# Altium footprint library heromap.PcbLib: 593 footprints (part 5 of 38)
Each footprint in its own frame and in the unit in brackets; x right, y up, seen from the top. Pads: shape width x height; smd on the part's side, far side on the other; paste and mask are expansions set on the pad; w line width, h text height; cw(c..) or ccw(c..) is an arc to the next point about the centre after c.
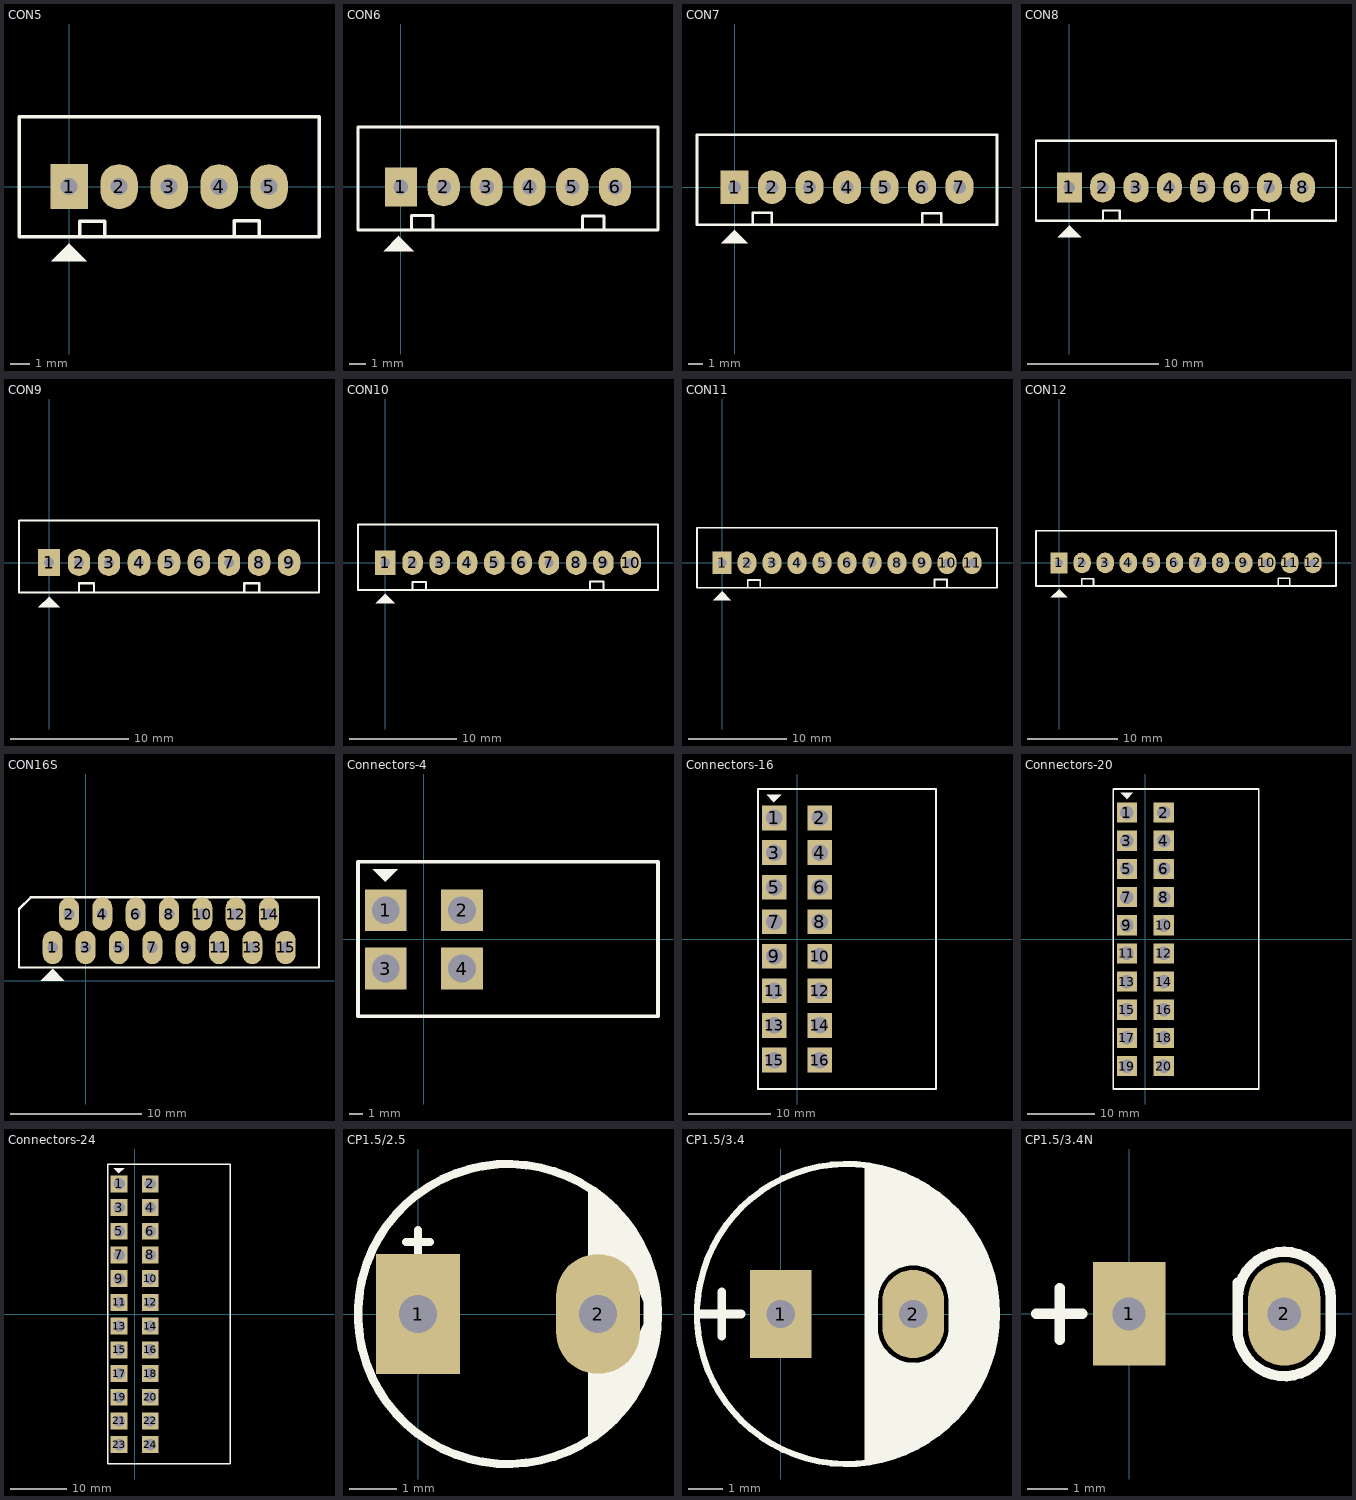
[diagram p4: the footprints below, top view; thin cyan lines are the x and y axes]

## CON5 [mil] "CON5"
height 200
pads (5):
  rect 75x90 hole 34: 1(0,0)
  oval 75x90 hole 34: 2(100,0) 3(200,0) 4(300,0) 5(400,0)
Top Overlay:
  region: -35.5,-149.5 35.5,-149.5 0.5,-114.5 0.5,-113.5
  lines w7: 21,-99 21,-69 71,-69 71,-99 ; 330,-98 330,-68 380,-68 380,-98 ; -100,-100 500,-100 500,0 500,140 -100,140 -100,-100

## CON6 [mil] "CON6"
height 200
pads (6):
  rect 75x90 hole 34: 1(0,0)
  oval 75x90 hole 34: 2(100,0) 3(200,0) 4(300,0) 5(400,0) 6(500,0)
Top Overlay:
  region: -40.5,-149.5 30.5,-149.5 -4.5,-114.5 -4.5,-113.5
  lines w7: 25,-97 25,-67 75,-67 75,-97 ; 424,-98 424,-68 474,-68 474,-98 ; -100,-100 600,-100 600,0 600,140 -100,140 -100,-100

## CON7 [mil] "CON7"
height 200
pads (7):
  rect 75x90 hole 34: 1(0,0)
  oval 75x90 hole 34: 2(100,0) 3(200,0) 4(300,0) 5(400,0) 6(500,0) 7(600,0)
Top Overlay:
  region: -35.5,-149.5 35.5,-149.5 0.5,-114.5 0.5,-113.5
  lines w7: 49,-98 49,-68 99,-68 99,-98 ; 501,-99 501,-69 551,-69 551,-99 ; -100,-100 -100,140 700,140 700,0 700,-100 -100,-100

## CON8 [mil] "CON8"
height 200
pads (8):
  rect 75x90 hole 34: 1(0,0)
  oval 75x90 hole 34: 2(100,0) 3(200,0) 4(300,0) 5(400,0) 6(500,0) 7(600,0) 8(700,0)
Top Overlay:
  region: -35.5,-149.5 35.5,-149.5 0.5,-114.5 0.5,-113.5
  lines w7: 101,-99 101,-69 151,-69 151,-99 ; 549,-98 549,-68 599,-68 599,-98 ; -100,-100 -100,140 800,140 800,0 800,-100 -100,-100

## CON9 [mil] "CON9"
height 200
pads (9):
  rect 75x90 hole 34: 1(0,0)
  oval 75x90 hole 34: 2(100,0) 3(200,0) 4(300,0) 5(400,0) 6(500,0) 7(600,0) 8(700,0) 9(800,0)
Top Overlay:
  region: -35.5,-149.5 35.5,-149.5 0.5,-114.5 0.5,-113.5
  lines w7: 100,-99 100,-69 150,-69 150,-99 ; 651,-99 651,-69 701,-69 701,-99 ; -100,-100 -100,140 900,140 900,0 900,-100 -100,-100

## CON10 [mil] "CON10"
height 200
pads (10):
  rect 75x90 hole 34: 1(0,0)
  oval 75x90 hole 34: 2(100,0) 3(200,0) 4(300,0) 5(400,0) 6(500,0) 7(600,0) 8(700,0) 9(800,0) 10(900,0)
Top Overlay:
  region: -35.5,-149.5 35.5,-149.5 0.5,-114.5 0.5,-113.5
  lines w7: 100,-100 100,-70 150,-70 150,-100 ; 750,-99 750,-69 800,-69 800,-99 ; -100,-100 -100,140 1000,140 1000,0 1000,-100 -100,-100

## CON11 [mil] "CON11"
height 200
pads (11):
  rect 75x90 hole 34: 1(0,0)
  oval 75x90 hole 34: 2(100,0) 3(200,0) 4(300,0) 5(400,0) 6(500,0) 7(600,0) 8(700,0) 9(800,0) 10(900,0) 11(1000,0)
Top Overlay:
  region: -35.5,-149.5 35.5,-149.5 0.5,-114.5 0.5,-113.5
  lines w7: 103,-99 103,-69 153,-69 153,-99 ; 850,-97 850,-67 900,-67 900,-97 ; -100,-100 -100,140 1100,140 1100,0 1100,-100 -100,-100

## CON12 [mil] "CON12"
height 200
pads (12):
  rect 75x90 hole 34: 1(0,0)
  oval 75x90 hole 34: 2(100,0) 3(200,0) 4(300,0) 5(400,0) 6(500,0) 7(600,0) 8(700,0) 9(800,0) 10(900,0) 11(1000,0) 12(1100,0)
Top Overlay:
  region: -35.5,-149.5 35.5,-149.5 0.5,-114.5 0.5,-113.5
  lines w7: 99,-99 99,-69 149,-69 149,-99 ; 950,-97 950,-67 1000,-67 1000,-97 ; -100,-100 -100,140 1200,140 1200,0 1200,-100 -100,-100

## CON16S [mil] "Jam 16S"
pads (15):
  oval 60x100 hole 32: 1(-99,100) 2(-50,200) 3(0,100) 4(50,200) 5(100,100) 6(150,200) 7(200,100) 8(250,200) 9(300,100) 10(350,200) 11(400,100) 12(450,200) 13(500,100) 14(550,200) 15(600,100)
Top Overlay:
  region: -135.5,0.5 -64.5,0.5 -99.5,35.5 -99.5,36.5
  lines w7: -200,40 700,40 700,250 -165,250 -200,215 -200,40

## Connectors-4 [mm]
pads (4):
  rect 3x3 hole 2: 1(-2.75,2.1) 2(2.75,2.1) 3(-2.75,-2.1) 4(2.75,-2.1)
Top Overlay:
  region: -1.892,5.067 -3.696,5.067 -2.807,4.178 -2.807,4.153
  lines w0.254: -4.759,-5.557 -4.759,5.617 16.9,5.617 16.9,-5.557 -4.759,-5.557
3D body: height 3.5, standoff 2.5, extent 2.032,1.294 4.75,2.818
3D body: height 7.7, standoff 6.7, extent -3.454,1.294 5.817,2.818
3D body: height 7.7, standoff -1, extent -3.454,1.294 -2.083,2.818
3D body: height 3.5, standoff 0, extent 2.057,1.294 3.454,2.818
3D body: height 3.5, standoff 0, extent 2.057,-2.906 3.454,-1.382
3D body: height 7.7, standoff -1, extent -3.454,-2.906 -2.083,-1.382
3D body: height 7.7, standoff 6.7, extent -3.454,-2.906 5.817,-1.382
3D body: height 3.5, standoff 2.5, extent 2.032,-2.906 4.75,-1.382
3D body: height 11.2, standoff 10.2, extent 13.818,-1.543 16.917,1.656
3D body: height 10.2, standoff 0, extent 3.873,-5.277 17.027,5.227

## Connectors-16 [mm]
pads (16):
  rect 3x3 hole 2: 1(-2.75,14.7) 2(2.75,14.7) 3(-2.75,10.5) 4(2.75,10.5) 5(-2.75,6.3) 6(2.75,6.3) 7(-2.75,2.1) 8(2.75,2.1) 9(-2.75,-2.1) 10(2.75,-2.1) 11(-2.75,-6.3) 12(2.75,-6.3) 13(-2.75,-10.5) 14(2.75,-10.5) 15(-2.75,-14.7) 16(2.75,-14.7)
Top Overlay:
  region: -1.892,17.513 -3.696,17.513 -2.807,16.624 -2.807,16.599
  lines w0.254: -4.759,-18.217 16.9,-18.217 16.9,18.217 -4.759,18.217 -4.759,-18.217
3D body: height 11.2, standoff 10.2, extent 13.801,-1.599 16.899,1.599
3D body: height 3.5, standoff 2.5, extent 2.032,-15.506 4.75,-13.982
3D body: height 7.7, standoff 6.7, extent -3.454,-15.506 5.817,-13.982
3D body: height 7.7, standoff -1, extent -3.454,-15.506 -2.083,-13.982
3D body: height 3.5, standoff 0, extent 2.057,-15.506 3.454,-13.982
3D body: height 3.5, standoff 2.5, extent 2.032,-11.306 4.75,-9.782
3D body: height 7.7, standoff 6.7, extent -3.454,-11.306 5.817,-9.782
3D body: height 7.7, standoff -1, extent -3.454,-11.306 -2.083,-9.782
3D body: height 3.5, standoff 0, extent 2.057,-11.306 3.454,-9.782
3D body: height 3.5, standoff 2.5, extent 2.032,-7.106 4.75,-5.582
3D body: height 7.7, standoff 6.7, extent -3.454,-7.106 5.817,-5.582
3D body: height 7.7, standoff -1, extent -3.454,-7.106 -2.083,-5.582
3D body: height 3.5, standoff 0, extent 2.057,-7.106 3.454,-5.582
3D body: height 3.5, standoff 2.5, extent 2.032,-2.906 4.75,-1.382
3D body: height 7.7, standoff 6.7, extent -3.454,-2.906 5.817,-1.382
3D body: height 7.7, standoff -1, extent -3.454,-2.906 -2.083,-1.382
3D body: height 3.5, standoff 0, extent 2.057,-2.906 3.454,-1.382
3D body: height 3.5, standoff 2.5, extent 2.032,1.294 4.75,2.818
3D body: height 7.7, standoff 6.7, extent -3.454,1.294 5.817,2.818
3D body: height 7.7, standoff -1, extent -3.454,1.294 -2.083,2.818
3D body: height 3.5, standoff 0, extent 2.057,1.294 3.454,2.818
3D body: height 3.5, standoff 2.5, extent 2.032,5.494 4.75,7.018
3D body: height 7.7, standoff 6.7, extent -3.454,5.494 5.817,7.018
3D body: height 7.7, standoff -1, extent -3.454,5.494 -2.083,7.018
3D body: height 3.5, standoff 0, extent 2.057,5.494 3.454,7.018
3D body: height 3.5, standoff 2.5, extent 2.032,9.694 4.75,11.218
3D body: height 7.7, standoff 6.7, extent -3.454,9.694 5.817,11.218
3D body: height 7.7, standoff -1, extent -3.454,9.694 -2.083,11.218
3D body: height 3.5, standoff 0, extent 2.057,9.694 3.454,11.218
3D body: height 3.5, standoff 0, extent 2.057,13.894 3.454,15.418
3D body: height 7.7, standoff -1, extent -3.454,13.894 -2.083,15.418
3D body: height 7.7, standoff 6.7, extent -3.454,13.894 5.817,15.418
3D body: height 10.2, standoff 0, extent 3.873,-17.827 17.027,17.827
3D body: height 3.5, standoff 2.5, extent 2.032,13.894 4.75,15.418

## Connectors-20 [mm]
pads (20):
  rect 3x3 hole 2: 1(-2.75,18.9) 2(2.75,18.9) 3(-2.75,14.7) 4(2.75,14.7) 5(-2.75,10.5) 6(2.75,10.5) 7(-2.75,6.3) 8(2.75,6.3) 9(-2.75,2.1) 10(2.75,2.1) 11(-2.75,-2.1) 12(2.75,-2.1) 13(-2.75,-6.3) 14(2.75,-6.3) 15(-2.75,-10.5) 16(2.75,-10.5) 17(-2.75,-14.7) 18(2.75,-14.7) 19(-2.75,-18.9) 20(2.75,-18.9)
Top Overlay:
  region: -1.848,21.831 -3.652,21.831 -2.763,20.942 -2.763,20.917
  lines w0.254: -4.759,-22.31 16.9,-22.31 16.9,22.417 -4.759,22.417 -4.759,-22.31
3D body: height 10.2, standoff 0, extent 3.81,-21.98 17.027,22.027
3D body: height 3.5, standoff 0, extent 2.057,-11.306 3.454,-9.782
3D body: height 7.7, standoff -1, extent -3.454,-11.306 -2.083,-9.782
3D body: height 7.7, standoff 6.7, extent -3.454,-11.306 5.817,-9.782
3D body: height 3.5, standoff 2.5, extent 2.032,-11.306 4.75,-9.782
3D body: height 3.5, standoff 2.5, extent 2.032,-11.306 4.75,-9.782
3D body: height 7.7, standoff -1, extent -3.454,-11.306 -2.083,-9.782
3D body: height 3.5, standoff 0, extent 2.057,-11.306 3.454,-9.782
3D body: height 3.5, standoff 0, extent 2.057,-15.506 3.454,-13.982
3D body: height 7.7, standoff -1, extent -3.454,-15.506 -2.083,-13.982
3D body: height 7.7, standoff 6.7, extent -3.454,-15.506 5.817,-13.982
3D body: height 3.5, standoff 2.5, extent 2.032,-15.506 4.75,-13.982
3D body: height 3.5, standoff 0, extent 2.057,-19.706 3.454,-18.182
3D body: height 7.7, standoff -1, extent -3.454,-19.706 -2.083,-18.182
3D body: height 7.7, standoff 6.7, extent -3.454,-19.706 5.817,-18.182
3D body: height 3.5, standoff 2.5, extent 2.032,-19.706 4.75,-18.182
3D body: height 11.2, standoff 10.2, extent 13.691,-1.481 16.79,1.718
3D body: height 3.5, standoff 2.5, extent 2.032,-7.106 4.75,-5.582
3D body: height 7.7, standoff 6.7, extent -3.454,-7.106 5.817,-5.582
3D body: height 7.7, standoff -1, extent -3.454,-7.106 -2.083,-5.582
3D body: height 3.5, standoff 0, extent 2.057,-7.106 3.454,-5.582
3D body: height 3.5, standoff 2.5, extent 2.032,-2.906 4.75,-1.382
3D body: height 7.7, standoff 6.7, extent -3.454,-2.906 5.817,-1.382
3D body: height 7.7, standoff -1, extent -3.454,-2.906 -2.083,-1.382
3D body: height 3.5, standoff 0, extent 2.057,-2.906 3.454,-1.382
3D body: height 3.5, standoff 2.5, extent 2.032,1.294 4.75,2.818
3D body: height 7.7, standoff 6.7, extent -3.454,1.294 5.817,2.818
3D body: height 7.7, standoff -1, extent -3.454,1.294 -2.083,2.818
3D body: height 3.5, standoff 0, extent 2.057,1.294 3.454,2.818
3D body: height 3.5, standoff 2.5, extent 2.032,5.494 4.75,7.018
3D body: height 7.7, standoff 6.7, extent -3.454,5.494 5.817,7.018
3D body: height 7.7, standoff -1, extent -3.454,5.494 -2.083,7.018
3D body: height 3.5, standoff 0, extent 2.057,5.494 3.454,7.018
3D body: height 3.5, standoff 2.5, extent 2.032,9.694 4.75,11.218
3D body: height 7.7, standoff 6.7, extent -3.454,9.694 5.817,11.218
3D body: height 7.7, standoff -1, extent -3.454,9.694 -2.083,11.218
3D body: height 3.5, standoff 0, extent 2.057,9.694 3.454,11.218
3D body: height 3.5, standoff 2.5, extent 2.032,13.894 4.75,15.418
3D body: height 7.7, standoff 6.7, extent -3.454,13.894 5.817,15.418
3D body: height 7.7, standoff -1, extent -3.454,13.894 -2.083,15.418
3D body: height 3.5, standoff 0, extent 2.057,13.894 3.454,15.418
3D body: height 3.5, standoff 0, extent 2.057,18.094 3.454,19.618
3D body: height 7.7, standoff -1, extent -3.454,18.094 -2.083,19.618
3D body: height 7.7, standoff 6.7, extent -3.454,18.094 5.817,19.618
3D body: height 3.5, standoff 2.5, extent 2.032,18.094 4.75,19.618

## Connectors-24 [mm]
pads (24):
  rect 3x3 hole 2: 1(-2.75,23.1) 2(2.75,23.1) 3(-2.75,18.9) 4(2.75,18.9) 5(-2.75,14.7) 6(2.75,14.7) 7(-2.75,10.5) 8(2.75,10.5) 9(-2.75,6.3) 10(2.75,6.3) 11(-2.75,2.1) 12(2.75,2.1) 13(-2.75,-2.1) 14(2.75,-2.1) 15(-2.75,-6.3) 16(2.75,-6.3) 17(-2.75,-10.5) 18(2.75,-10.5) 19(-2.75,-14.7) 20(2.75,-14.7) 21(-2.75,-18.9) 22(2.75,-18.9) 23(-2.75,-23.1) 24(2.75,-23.1)
Top Overlay:
  region: -1.892,25.895 -3.696,25.895 -2.807,25.006 -2.807,24.981
  lines w0.254: -4.759,-26.525 -4.759,26.617 16.9,26.617 16.9,-26.525 -4.759,-26.525
3D body: height 3.5, standoff 2.5, extent 2.032,22.294 4.75,23.818
3D body: height 7.7, standoff 6.7, extent -3.454,22.294 5.817,23.818
3D body: height 7.7, standoff -1, extent -3.454,22.294 -2.083,23.818
3D body: height 3.5, standoff 0, extent 2.057,22.294 3.454,23.818
3D body: height 3.5, standoff 0, extent 2.057,18.094 3.454,19.618
3D body: height 7.7, standoff -1, extent -3.454,18.094 -2.083,19.618
3D body: height 7.7, standoff 6.7, extent -3.454,18.094 5.817,19.618
3D body: height 3.5, standoff 2.5, extent 2.032,18.094 4.75,19.618
3D body: height 3.5, standoff 0, extent 2.057,13.894 3.454,15.418
3D body: height 7.7, standoff -1, extent -3.454,13.894 -2.083,15.418
3D body: height 7.7, standoff 6.7, extent -3.454,13.894 5.817,15.418
3D body: height 3.5, standoff 2.5, extent 2.032,13.894 4.75,15.418
3D body: height 3.5, standoff 0, extent 2.057,9.694 3.454,11.218
3D body: height 7.7, standoff -1, extent -3.454,9.694 -2.083,11.218
3D body: height 7.7, standoff 6.7, extent -3.454,9.694 5.817,11.218
3D body: height 3.5, standoff 2.5, extent 2.032,9.694 4.75,11.218
3D body: height 3.5, standoff 0, extent 2.057,5.494 3.454,7.018
3D body: height 7.7, standoff -1, extent -3.454,5.494 -2.083,7.018
3D body: height 7.7, standoff 6.7, extent -3.454,5.494 5.817,7.018
3D body: height 3.5, standoff 2.5, extent 2.032,5.494 4.75,7.018
3D body: height 3.5, standoff 0, extent 2.057,1.294 3.454,2.818
3D body: height 7.7, standoff -1, extent -3.454,1.294 -2.083,2.818
3D body: height 7.7, standoff 6.7, extent -3.454,1.294 5.817,2.818
3D body: height 3.5, standoff 2.5, extent 2.032,1.294 4.75,2.818
3D body: height 3.5, standoff 0, extent 2.057,-2.906 3.454,-1.382
3D body: height 7.7, standoff -1, extent -3.454,-2.906 -2.083,-1.382
3D body: height 7.7, standoff 6.7, extent -3.454,-2.906 5.817,-1.382
3D body: height 3.5, standoff 2.5, extent 2.032,-2.906 4.75,-1.382
3D body: height 11.2, standoff 10.2, extent 13.716,-1.861 16.815,1.338
3D body: height 3.5, standoff 2.5, extent 2.032,-23.906 4.75,-22.382
3D body: height 7.7, standoff 6.7, extent -3.454,-23.906 5.817,-22.382
3D body: height 7.7, standoff -1, extent -3.454,-23.906 -2.083,-22.382
3D body: height 3.5, standoff 0, extent 2.057,-23.906 3.454,-22.382
3D body: height 3.5, standoff 2.5, extent 2.032,-19.706 4.75,-18.182
3D body: height 7.7, standoff 6.7, extent -3.454,-19.706 5.817,-18.182
3D body: height 7.7, standoff -1, extent -3.454,-19.706 -2.083,-18.182
3D body: height 3.5, standoff 0, extent 2.057,-19.706 3.454,-18.182
3D body: height 3.5, standoff 2.5, extent 2.032,-15.506 4.75,-13.982
3D body: height 7.7, standoff 6.7, extent -3.454,-15.506 5.817,-13.982
3D body: height 7.7, standoff -1, extent -3.454,-15.506 -2.083,-13.982
3D body: height 3.5, standoff 0, extent 2.057,-15.506 3.454,-13.982
3D body: height 3.5, standoff 2.5, extent 2.032,-11.306 4.75,-9.782
3D body: height 7.7, standoff 6.7, extent -3.454,-11.306 5.817,-9.782
3D body: height 7.7, standoff -1, extent -3.454,-11.306 -2.083,-9.782
3D body: height 3.5, standoff 0, extent 2.057,-11.306 3.454,-9.782
3D body: height 3.5, standoff 0, extent 2.057,-7.106 3.454,-5.582
3D body: height 7.7, standoff -1, extent -3.454,-7.106 -2.083,-5.582
3D body: height 3.5, standoff 2.5, extent 2.032,-7.106 4.75,-5.582
3D body: height 3.5, standoff 2.5, extent 2.032,-7.106 4.75,-5.582
3D body: height 7.7, standoff 6.7, extent -3.454,-7.106 5.817,-5.582
3D body: height 7.7, standoff -1, extent -3.454,-7.106 -2.083,-5.582
3D body: height 3.5, standoff 0, extent 2.057,-7.106 3.454,-5.582
3D body: height 10.2, standoff 0, extent 3.81,-26.55 17.027,26.227

## CP1.5/2.5 [mil] "Tu hoa 33 >100 uF,50V, 220uF/16V,25V ( it su dung )"
height 300
pads (2):
  rect 70x100 hole 32: 1(0,0)
  oval 70x100 hole 32: 2(150,0)
Top Overlay:
  circle w7: c75,0 r125
  region: 142,106 142,39 156,39 173,35 182,25 188,10 188,-8 183,-19 183,-19.53 171,-33 155,-38 142,-41 142,-107 156,-96 177,-72 194,-40 199,-14 200,0 198,24 189,50 175,74 160,93
  lines w7: -10,60 10,60 ; 0,50 0,70
3D body "User Library-Cap 6_3x11.STEP": height 421.54, standoff -759.57, extent -49.02,-125.03 199.02,123

## CP1.5/3.4 [mil] "Tu hoa 220->470uF,16V, 470uF/16V,25V"
height 300
pads (2):
  rect 70x100 hole 32: 1(0,0)
  oval 70x100 hole 32: 2(150,0)
Top Overlay:
  circle w7: c75,0 r170
  region: 100,25 135,60 162.93,60 164.6,59.92 167.88,59.26 170.98,57.98 173.76,56.12 175,55 181.46,48.54 182.26,47.66 183.57,45.69 184.48,43.5 184.94,41.18 185,40 190,35 191.12,33.76 192.98,30.98 194.26,27.88 194.92,24.6 195,22.93 195,-27.93 194.92,-29.6 194.26,-32.88 192.98,-35.98 191.12,-38.76 190,-40 178.54,-51.46 177.66,-52.26 175.69,-53.57 173.5,-54.48 171.18,-54.94 170,-55 168.76,-56.12 165.98,-57.98 162.88,-59.26 159.6,-59.92 157.93,-60 144.14,-60 140.8,-59.84 134.23,-58.53 128.05,-55.97 122.48,-52.25 120,-50 108.54,-38.54 107.74,-37.66 106.43,-35.69 105.52,-33.5 105.06,-31.18 105,-30 100,-30 100,-170 155,-150 195,-120 225,-80 245,-20 245,20 230,70 200,115 165,145 120,165 100,170
  lines w10: -90,0 -45,0 ; -67,-25 -67,25 ; 100,-165 100,165 ; 100,25 105,25 ; 105,-20 105,30 ; 105,-10 ccw(c150,-15) 145,-60 ccw(c150,-15) 195,-20 195,15 ccw(c150,15) 150,60 ccw(c150,15) 105,15
3D body "User Library-CAP 8X11_5.STEP": height 445.89, standoff -754.41, extent -84.96,-157.48 230,157.48

## CP1.5/3.4N [mil] "Tu hoa 220->470uF,16V, 470uF/16V,25V"
height 300
pads (2):
  rect 70x100 hole 32: 1(0,0)
  oval 70x100 hole 32: 2(150,0)
Top Overlay:
  lines w10: -90,0 -45,0 ; -67,-25 -67,25 ; 105,-20 105,30 ; 105,-10 ccw(c150,-15) 145,-60 ccw(c150,-15) 195,-20 195,15 ccw(c150,15) 150,60 ccw(c150,15) 105,15
3D body: height 372.62, standoff 19.68, extent -96.82,-542.44 256.82,-70